# Altium footprint library Miscellaneous THD.PcbLib: 216 footprints (part 2 of 15)
Each footprint in its own frame and in the unit in brackets; x right, y up, seen from the top. Pads: shape width x height; smd on the part's side, far side on the other; paste and mask are expansions set on the pad; w line width, h text height; cw(c..) or ccw(c..) is an arc to the next point about the centre after c.
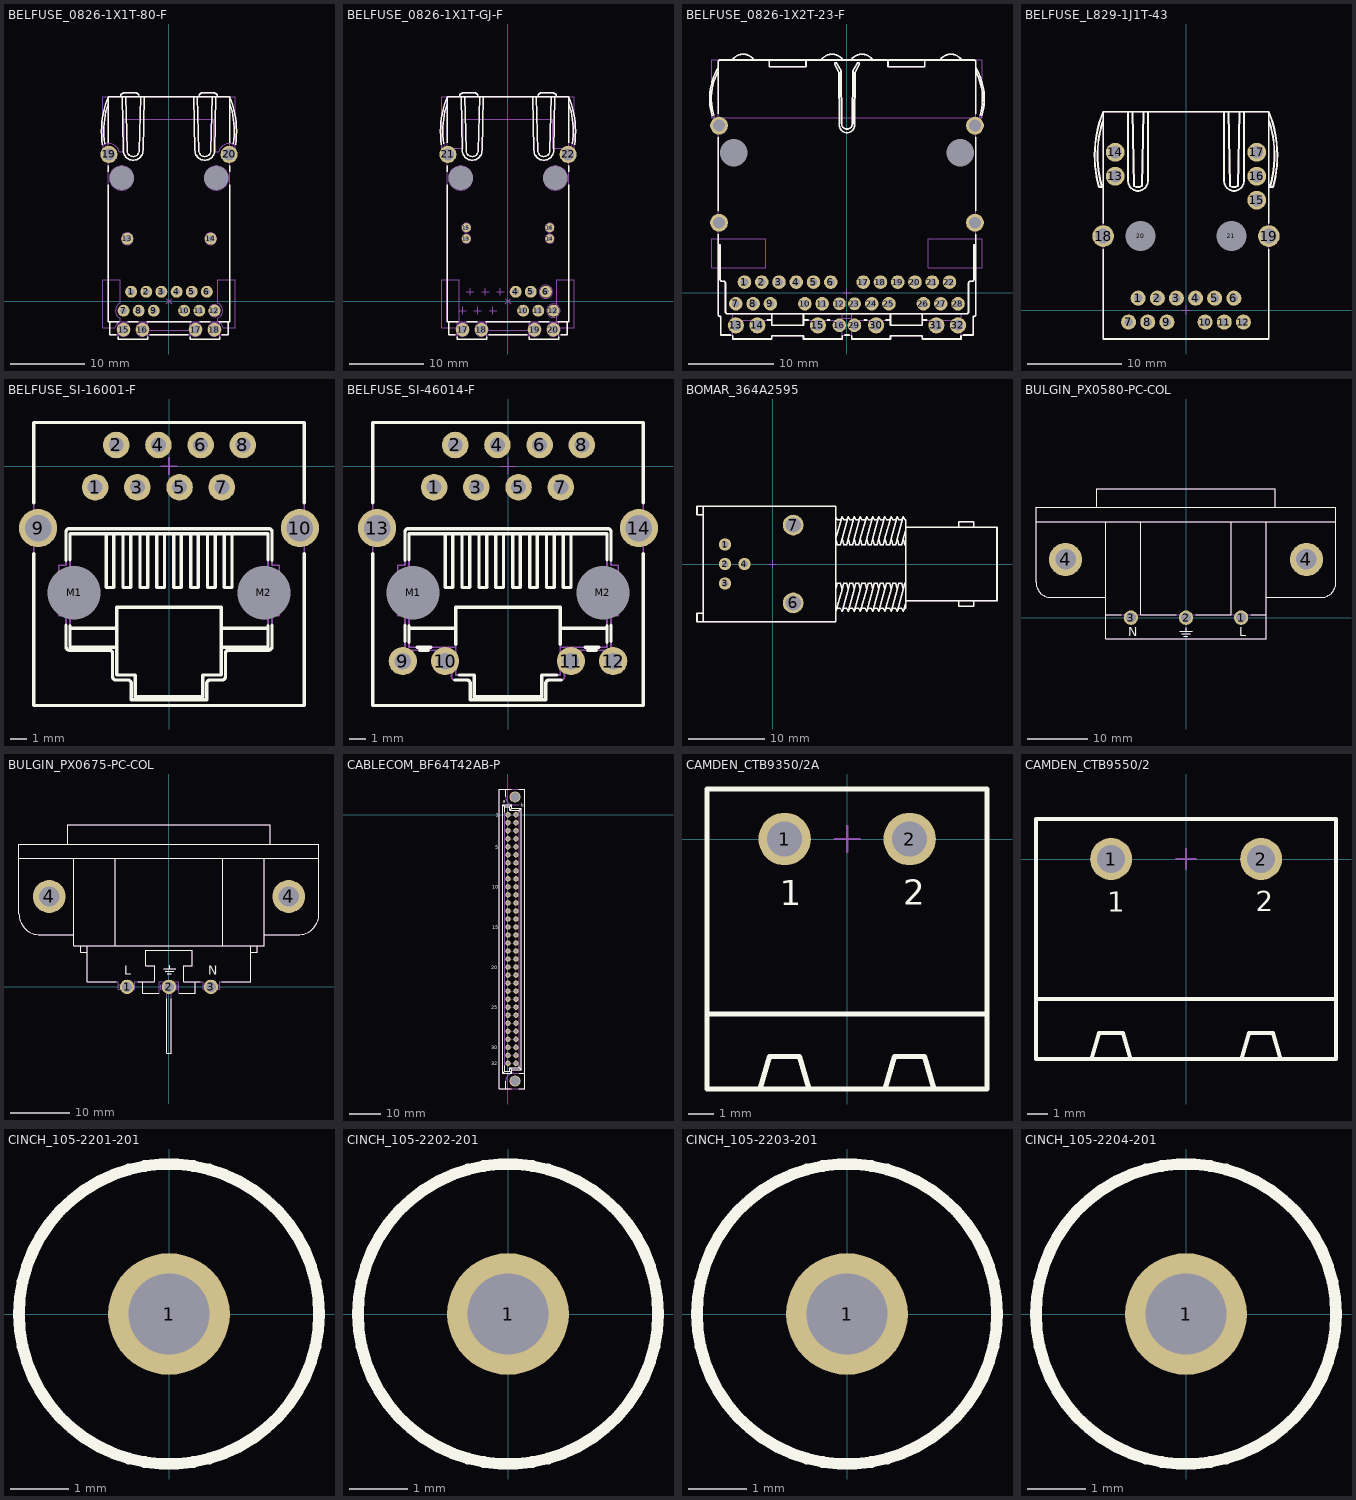
[diagram p1: the footprints below, top view; thin cyan lines are the x and y axes]

## BELFUSE_0826-1X1T-80-F [mm] "1 Port, Orange Green/Yellow LEDs, RJ45 1000BaseT, PoE, Gigabit MagJack® Connector Module"
height 13.61
pads (22):
  round 1.6 hole 0.9: 1(-5.075,1.27) 2(-3.045,1.27) 3(-1.015,1.27) 4(1.016,1.27) 5(3.048,1.27) 6(5.08,1.27) 7(-6.095,-1.27) 8(-4.065,-1.27) 9(-2.035,-1.27) 10(2.032,-1.27) 11(4.064,-1.27) 12(6.096,-1.27) 13(-5.59,8.38) 14(5.59,8.38)
  round 1.8 hole 1.1: 15(-6.096,-3.81) 16(-3.556,-3.81) 17(3.556,-3.81) 18(6.096,-3.81)
  round 2.3 hole 1.6: 19(-8.065,19.685) 20(8.065,19.685)
  round 1 hole 3.25 unplated mask+1.125: 21(-6.35,16.51) 22(6.35,16.51)
Top Overlay:
  lines w0.2: -8.924,20.975 cw(c3.316,22.785) -8.15,27.435 ; -8.642,21.124 cw(c3.316,22.785) -8.15,26.565 ; -8.15,15.638 -8.15,-2.765 -6.685,-2.765 ; -8.15,17.382 -8.15,18.137 ; -8.15,21.233 -8.15,27.435 ; -7.95,-2.765 -7.95,-4.465 -7.1,-4.465 ; -6.826,-4.762 -6.826,-5.065 -2.826,-5.065 -2.826,-4.763 ; -6.5,27.435 cw(c-6,27.435) -6,27.935 -4.5,27.935 cw(c-4.5,27.435) -4,27.435 ; -6.3,27.435 -6.12,20.222 ccw(c-4.8,20.222) -3.48,20.222 -3.3,27.435 ; -5.8,27.435 -5.619,20.222 ccw(c-4.8,20.222) -3.981,20.201 -3.8,27.435 ; -5.505,-2.765 -4.145,-2.765 ; -2.965,-2.765 2.965,-2.765 ; -2.549,-4.465 2.55,-4.465 ; 2.826,-4.763 2.826,-5.065 6.826,-5.065 6.826,-4.762 ; 3.3,27.435 3.48,20.222 ccw(c4.8,20.222) 6.12,20.222 6.3,27.435 ; 3.8,27.435 3.981,20.201 ccw(c4.8,20.222) 5.619,20.222 5.8,27.435 ; 4,27.435 cw(c4.5,27.435) 4.5,27.935 6,27.935 cw(c6,27.435) 6.5,27.435 ; 4.145,-2.765 5.505,-2.765 ; 6.685,-2.765 8.15,-2.765 8.15,15.638 ; 7.101,-4.465 7.95,-4.465 7.95,-2.765 ; 8.15,17.382 8.15,18.137 ; 8.15,21.233 8.15,27.435 ; 8.15,26.565 cw(c-3.316,22.785) 8.642,21.124 ; 8.924,20.975 ccw(c-3.316,22.785) 8.15,27.435 ; -8.15,27.435 8.15,27.435
Mechanical 8:
  circle w0.1: c5.075,1.27 r0.45
  circle w0.1: c-5.59,8.38 r0.45
  circle w0.1: c5.59,8.38 r0.45
  circle w0.1: c-5.59,8.38 r0.8
  circle w0.1: c5.59,8.38 r0.8
  circle w0.1: c6.095,-1.27 r0.45
  circle w0.1: c6.095,-3.81 r0.5
  circle w0.1: c-6.095,-3.81 r0.5
  circle w0.1: c6.095,-1.27 r0.8
  circle w0.1: c3.555,-3.81 r0.9
  circle w0.1: c-3.555,-3.81 r0.9
  circle w0.1: c-6.095,-3.81 r0.9
  circle w0.1: c6.095,-3.81 r0.9
  circle w0.1: c8.065,19.68 r0.785
  circle w0.1: c-8.065,19.68 r0.785
  circle w0.1: c-6.35,16.51 r1.625
  circle w0.1: c6.35,16.51 r1.625
  lines w0.1: -8.565,19.68 -8.065,19.68 ; -8.065,19.18 -8.065,19.68 ; -8.065,20.18 -8.065,19.68 ; -7.565,19.68 -8.065,19.68 ; -6.85,16.51 -6.35,16.51 ; -6.595,-3.81 -6.095,-3.81 ; -6.585,-1.27 -6.085,-1.27 ; -6.35,16.01 -6.35,16.51 ; -6.35,17.01 -6.35,16.51 ; -6.095,-4.31 -6.095,-3.81 ; -6.095,-3.31 -6.095,-3.81 ; -6.09,8.38 -5.59,8.38 ; -6.085,-1.77 -6.085,-1.27 ; -6.085,-0.77 -6.085,-1.27 ; -5.85,16.51 -6.35,16.51 ; -5.595,-3.81 -6.095,-3.81 ; -5.59,7.88 -5.59,8.38 ; -5.59,8.88 -5.59,8.38 ; -5.585,-1.27 -6.085,-1.27 ; -5.575,1.27 -5.075,1.27 ; -5.09,8.38 -5.59,8.38 ; -5.075,0.77 -5.075,1.27 ; -5.075,1.77 -5.075,1.27 ; -4.575,1.27 -5.075,1.27 ; -4.555,-1.27 -4.055,-1.27 ; -4.055,-3.81 -3.555,-3.81 ; -4.055,-1.77 -4.055,-1.27 ; -4.055,-0.77 -4.055,-1.27 ; -3.555,-4.31 -3.555,-3.81 ; -3.555,-3.31 -3.555,-3.81 ; -3.555,-1.27 -4.055,-1.27 ; -3.545,1.27 -3.045,1.27 ; -3.055,-3.81 -3.555,-3.81 ; -3.045,0.77 -3.045,1.27 ; -3.045,1.77 -3.045,1.27 ; -2.545,1.27 -3.045,1.27 ; -2.525,-1.27 -2.025,-1.27 ; -2.025,-1.77 -2.025,-1.27 ; -2.025,-0.77 -2.025,-1.27 ; -1.525,-1.27 -2.025,-1.27 ; -1.515,1.27 -1.015,1.27 ; -1.015,0.77 -1.015,1.27 ; -1.015,1.77 -1.015,1.27 ; -0.515,1.27 -1.015,1.27 ; -0.354,-0.354 0,0 ; -0.354,0.354 0,0 ; 0.354,-0.354 0,0 ; 0.354,0.354 0,0 ; 0.515,1.27 1.015,1.27 ; 1.015,0.77 1.015,1.27 ; 1.015,1.77 1.015,1.27 ; 1.515,1.27 1.015,1.27 ; 1.535,-1.27 2.035,-1.27 ; 2.035,-1.77 2.035,-1.27 ; 2.035,-0.77 2.035,-1.27 ; 2.535,-1.27 2.035,-1.27 ; 2.545,1.27 3.045,1.27 ; 3.045,0.77 3.045,1.27 ; 3.045,1.77 3.045,1.27 ; 3.055,-3.81 3.555,-3.81 ; 3.545,1.27 3.045,1.27 ; 3.555,-4.31 3.555,-3.81 ; 3.555,-3.31 3.555,-3.81 ; 3.565,-1.27 4.065,-1.27 ; 4.055,-3.81 3.555,-3.81 ; 4.065,-1.77 4.065,-1.27 ; 4.065,-0.77 4.065,-1.27 ; 4.565,-1.27 4.065,-1.27 ; 4.575,1.27 5.075,1.27 ; 5.075,0.77 5.075,1.27 ; 5.075,1.77 5.075,1.27 ; 5.09,8.38 5.59,8.38 ; 5.575,1.27 5.075,1.27 ; 5.59,7.88 5.59,8.38 ; 5.59,8.88 5.59,8.38 ; 5.595,-3.81 6.095,-3.81 ; 5.595,-1.27 6.095,-1.27 ; 5.85,16.51 6.35,16.51 ; 6.09,8.38 5.59,8.38 ; 6.095,-4.31 6.095,-3.81 ; 6.095,-3.31 6.095,-3.81 ; 6.095,-1.77 6.095,-1.27 ; 6.095,-0.77 6.095,-1.27 ; 6.35,16.01 6.35,16.51 ; 6.35,17.01 6.35,16.51 ; 6.595,-3.81 6.095,-3.81 ; 6.595,-1.27 6.095,-1.27 ; 6.85,16.51 6.35,16.51 ; 7.565,19.68 8.065,19.68 ; 8.065,19.18 8.065,19.68 ; 8.065,20.18 8.065,19.68 ; 8.565,19.68 8.065,19.68 ; -8.915,-3.56 -7.269,-3.56 cw(c-6.095,-3.81) -6.555,-2.702 -6.555,-2.265 cw(c-6.085,-1.27) -6.555,-0.275 -6.555,2.91 -8.915,2.91 -8.915,-3.56 ; -8.915,20.855 cw(c-8.065,19.68) -6.666,20.06 -5.995,20.06 -5.995,24.38 5.995,24.38 5.995,20.06 6.666,20.06 cw(c8.065,19.68) 8.915,20.855 8.915,27.43 -8.915,27.43 -8.915,20.855 ; 6.555,-2.702 cw(c6.095,-3.81) 7.269,-3.56 8.915,-3.56 8.915,2.91 6.555,2.91 6.555,-0.271 cw(c6.095,-1.27) 6.555,-2.269 6.555,-2.702
  text "Via KEEPOUT" at -5.2,25.45 h1
Mechanical 14:
  lines w0.1: -8.15,26.565 ccw(c3.316,22.785) -8.306,19.516 -8.595,19.435 cw(c3.316,22.785) -8.15,27.435 ; -7.95,-2.765 -7.95,-4.465 -6.826,-4.465 ; -6.826,-2.765 -6.826,-5.065 -2.826,-5.065 -2.826,-2.765 ; -6.5,27.435 cw(c-6,27.435) -6,27.935 -4.5,27.935 cw(c-4.5,27.435) -4,27.435 ; -6.3,27.435 -6.12,20.222 ccw(c-4.8,20.222) -3.48,20.222 -3.3,27.435 ; -5.8,27.435 -5.619,20.222 ccw(c-4.8,20.222) -3.981,20.201 -3.8,27.435 ; -2.826,-4.465 2.826,-4.465 ; -2.826,-3.865 2.826,-3.865 ; 2.826,-2.765 2.826,-5.065 6.826,-5.065 6.826,-2.765 ; 3.3,27.435 3.48,20.222 ccw(c4.8,20.222) 6.12,20.222 6.3,27.435 ; 3.8,27.435 3.981,20.201 ccw(c4.8,20.222) 5.619,20.222 5.8,27.435 ; 4,27.435 cw(c4.5,27.435) 4.5,27.935 6,27.935 cw(c6,27.435) 6.5,27.435 ; 6.826,-4.465 7.95,-4.465 7.95,-2.765 ; 8.15,26.565 cw(c-3.316,22.785) 8.306,19.516 8.595,19.435 ccw(c-3.316,22.785) 8.15,27.435 ; -8.15,27.435 -8.15,-2.765 8.15,-2.765 8.15,27.435 ; -8.15,27.435 8.15,27.435
3D body "BELFUSE_0826-1X1T-80-F.stp": height 14.51, standoff -3.47, extent -9.055,-5.065 9.055,27.935

## BELFUSE_0826-1X1T-GJ-F [mm] "1 Port, Orange Green/Yellow LEDs, RJ45 10/100BaseT, PoE, Ethernet MagJack® Connector Module"
height 13.61
pads (18):
  round 1.6 hole 0.9: 4(1.016,1.27) 5(3.048,1.27) 6(5.08,1.27) 10(2.032,-1.27) 11(4.064,-1.27) 12(6.096,-1.27)
  round 1.2 hole 0.6: 13(-5.59,8.38) 14(5.59,8.38) 15(-5.59,9.87) 16(5.59,9.87)
  round 1.8 hole 1.1: 17(-6.096,-3.81) 18(-3.556,-3.81) 19(3.556,-3.81) 20(6.096,-3.81)
  round 2.3 hole 1.6: 21(-8.065,19.685) 22(8.065,19.685)
  round 1 hole 3.25 unplated mask+1.125: 23(-6.35,16.51) 24(6.35,16.51)
Top Overlay:
  lines w0.2: -8.924,20.975 cw(c3.316,22.785) -8.15,27.435 ; -8.642,21.124 cw(c3.316,22.785) -8.15,26.565 ; -8.15,15.638 -8.15,-2.765 -6.685,-2.765 ; -8.15,17.382 -8.15,18.137 ; -8.15,21.233 -8.15,27.435 ; -7.95,-2.765 -7.95,-4.465 -7.1,-4.465 ; -6.826,-4.762 -6.826,-5.065 -2.826,-5.065 -2.826,-4.763 ; -6.5,27.435 cw(c-6,27.435) -6,27.935 -4.5,27.935 cw(c-4.5,27.435) -4,27.435 ; -6.3,27.435 -6.12,20.222 ccw(c-4.8,20.222) -3.48,20.222 -3.3,27.435 ; -5.8,27.435 -5.619,20.222 ccw(c-4.8,20.222) -3.981,20.201 -3.8,27.435 ; -5.505,-2.765 -4.145,-2.765 ; -2.965,-2.765 2.965,-2.765 ; -2.549,-4.465 2.55,-4.465 ; 2.826,-4.763 2.826,-5.065 6.826,-5.065 6.826,-4.762 ; 3.3,27.435 3.48,20.222 ccw(c4.8,20.222) 6.12,20.222 6.3,27.435 ; 3.8,27.435 3.981,20.201 ccw(c4.8,20.222) 5.619,20.222 5.8,27.435 ; 4,27.435 cw(c4.5,27.435) 4.5,27.935 6,27.935 cw(c6,27.435) 6.5,27.435 ; 4.145,-2.765 5.505,-2.765 ; 6.685,-2.765 8.15,-2.765 8.15,15.638 ; 7.101,-4.465 7.95,-4.465 7.95,-2.765 ; 8.15,17.382 8.15,18.137 ; 8.15,21.233 8.15,27.435 ; 8.15,26.565 cw(c-3.316,22.785) 8.642,21.124 ; 8.924,20.975 ccw(c-3.316,22.785) 8.15,27.435 ; -8.15,27.435 8.15,27.435
Mechanical 8:
  circle w0.1: c5.59,9.87 r0.35
  circle w0.1: c5.59,9.87 r0.6
  circle w0.1: c5.59,8.38 r0.35
  circle w0.1: c5.59,8.38 r0.6
  circle w0.1: c6.35,16.51 r1.625
  circle w0.1: c-6.35,16.51 r1.625
  circle w0.1: c-8.065,19.68 r0.785
  circle w0.1: c8.065,19.68 r0.785
  circle w0.1: c6.095,-3.81 r0.9
  circle w0.1: c-6.095,-3.81 r0.9
  circle w0.1: c-3.555,-3.81 r0.9
  circle w0.1: c3.555,-3.81 r0.9
  circle w0.1: c6.095,-1.27 r0.9
  circle w0.1: c5.075,1.27 r0.9
  circle w0.1: c-5.59,9.87 r0.6
  circle w0.1: c-5.59,8.38 r0.6
  circle w0.1: c-6.095,-3.81 r0.5
  circle w0.1: c6.095,-3.81 r0.5
  circle w0.1: c6.095,-1.27 r0.45
  circle w0.1: c-5.59,9.87 r0.35
  circle w0.1: c-5.59,8.38 r0.35
  lines w0.1: -8.565,19.68 -8.065,19.68 ; -8.065,19.18 -8.065,19.68 ; -8.065,20.18 -8.065,19.68 ; -7.565,19.68 -8.065,19.68 ; -6.85,16.51 -6.35,16.51 ; -6.595,-3.81 -6.095,-3.81 ; -6.595,-1.27 -6.095,-1.27 ; -6.35,16.01 -6.35,16.51 ; -6.35,17.01 -6.35,16.51 ; -6.095,-4.31 -6.095,-3.81 ; -6.095,-3.31 -6.095,-3.81 ; -6.095,-1.77 -6.095,-1.27 ; -6.095,-0.77 -6.095,-1.27 ; -6.09,8.38 -5.59,8.38 ; -6.09,9.87 -5.59,9.87 ; -5.85,16.51 -6.35,16.51 ; -5.595,-3.81 -6.095,-3.81 ; -5.595,-1.27 -6.095,-1.27 ; -5.59,7.88 -5.59,8.38 ; -5.59,8.88 -5.59,8.38 ; -5.59,9.37 -5.59,9.87 ; -5.59,10.37 -5.59,9.87 ; -5.575,1.27 -5.075,1.27 ; -5.09,8.38 -5.59,8.38 ; -5.09,9.87 -5.59,9.87 ; -5.075,0.77 -5.075,1.27 ; -5.075,1.77 -5.075,1.27 ; -4.575,1.27 -5.075,1.27 ; -4.565,-1.27 -4.065,-1.27 ; -4.065,-1.77 -4.065,-1.27 ; -4.065,-0.77 -4.065,-1.27 ; -4.055,-3.81 -3.555,-3.81 ; -3.565,-1.27 -4.065,-1.27 ; -3.555,-4.31 -3.555,-3.81 ; -3.555,-3.31 -3.555,-3.81 ; -3.545,1.27 -3.045,1.27 ; -3.055,-3.81 -3.555,-3.81 ; -3.045,0.77 -3.045,1.27 ; -3.045,1.77 -3.045,1.27 ; -2.545,1.27 -3.045,1.27 ; -2.535,-1.27 -2.035,-1.27 ; -2.035,-1.77 -2.035,-1.27 ; -2.035,-0.77 -2.035,-1.27 ; -1.535,-1.27 -2.035,-1.27 ; -1.515,1.27 -1.015,1.27 ; -1.015,0.77 -1.015,1.27 ; -1.015,1.77 -1.015,1.27 ; -0.515,1.27 -1.015,1.27 ; -0.354,-0.354 0,0 ; -0.354,0.354 0,0 ; 0.354,-0.354 0,0 ; 0.354,0.354 0,0 ; 0.515,1.27 1.015,1.27 ; 1.015,0.77 1.015,1.27 ; 1.015,1.77 1.015,1.27 ; 1.515,1.27 1.015,1.27 ; 1.535,-1.27 2.035,-1.27 ; 2.035,-1.77 2.035,-1.27 ; 2.035,-0.77 2.035,-1.27 ; 2.535,-1.27 2.035,-1.27 ; 2.545,1.27 3.045,1.27 ; 3.045,0.77 3.045,1.27 ; 3.045,1.77 3.045,1.27 ; 3.055,-3.81 3.555,-3.81 ; 3.545,1.27 3.045,1.27 ; 3.555,-4.31 3.555,-3.81 ; 3.555,-3.31 3.555,-3.81 ; 3.565,-1.27 4.065,-1.27 ; 4.055,-3.81 3.555,-3.81 ; 4.065,-1.77 4.065,-1.27 ; 4.065,-0.77 4.065,-1.27 ; 4.565,-1.27 4.065,-1.27 ; 4.575,1.27 5.075,1.27 ; 5.075,0.77 5.075,1.27 ; 5.075,1.77 5.075,1.27 ; 5.09,8.38 5.59,8.38 ; 5.09,9.87 5.59,9.87 ; 5.575,1.27 5.075,1.27 ; 5.59,7.88 5.59,8.38 ; 5.59,8.88 5.59,8.38 ; 5.59,9.37 5.59,9.87 ; 5.59,10.37 5.59,9.87 ; 5.595,-3.81 6.095,-3.81 ; 5.595,-1.27 6.095,-1.27 ; 5.85,16.51 6.35,16.51 ; 6.09,8.38 5.59,8.38 ; 6.09,9.87 5.59,9.87 ; 6.095,-4.31 6.095,-3.81 ; 6.095,-3.31 6.095,-3.81 ; 6.095,-1.77 6.095,-1.27 ; 6.095,-0.77 6.095,-1.27 ; 6.35,16.01 6.35,16.51 ; 6.35,17.01 6.35,16.51 ; 6.595,-3.81 6.095,-3.81 ; 6.595,-1.27 6.095,-1.27 ; 6.85,16.51 6.35,16.51 ; 7.565,19.68 8.065,19.68 ; 8.065,19.18 8.065,19.68 ; 8.065,20.18 8.065,19.68 ; 8.565,19.68 8.065,19.68 ; -8.915,-3.56 -8.915,2.91 -6.555,2.91 -6.555,-3.56 -8.915,-3.56 ; -8.915,20.52 -8.915,27.43 8.915,27.43 8.915,20.52 5.995,20.52 5.995,24.38 -5.995,24.38 -5.995,20.52 -8.915,20.52 ; 6.555,-3.56 6.555,2.91 8.915,2.91 8.915,-3.56 6.555,-3.56
Mechanical 14:
  lines w0.1: -8.15,26.565 ccw(c3.316,22.785) -8.306,19.516 -8.595,19.435 cw(c3.316,22.785) -8.15,27.435 ; -7.95,-2.765 -7.95,-4.465 -6.826,-4.465 ; -6.826,-2.765 -6.826,-5.065 -2.826,-5.065 -2.826,-2.765 ; -6.5,27.435 cw(c-6,27.435) -6,27.935 -4.5,27.935 cw(c-4.5,27.435) -4,27.435 ; -6.3,27.435 -6.12,20.222 ccw(c-4.8,20.222) -3.48,20.222 -3.3,27.435 ; -5.8,27.435 -5.619,20.222 ccw(c-4.8,20.222) -3.981,20.201 -3.8,27.435 ; -2.826,-4.465 2.826,-4.465 ; -2.826,-3.865 2.826,-3.865 ; 2.826,-2.765 2.826,-5.065 6.826,-5.065 6.826,-2.765 ; 3.3,27.435 3.48,20.222 ccw(c4.8,20.222) 6.12,20.222 6.3,27.435 ; 3.8,27.435 3.981,20.201 ccw(c4.8,20.222) 5.619,20.222 5.8,27.435 ; 4,27.435 cw(c4.5,27.435) 4.5,27.935 6,27.935 cw(c6,27.435) 6.5,27.435 ; 6.826,-4.465 7.95,-4.465 7.95,-2.765 ; 8.15,26.565 cw(c-3.316,22.785) 8.306,19.516 8.595,19.435 ccw(c-3.316,22.785) 8.15,27.435 ; -8.15,27.435 -8.15,-2.765 8.15,-2.765 8.15,27.435 ; -8.15,27.435 8.15,27.435
3D body "BELFUSE_0826-1X1T-GJ-F.stp": height 14.51, standoff -3.47, extent -9.055,-5.065 9.055,27.935

## BELFUSE_0826-1X2T-23-F [mm] "1 Port, Orange Green/Yellow LEDs, RJ45 1000BaseT, PoE, Gigabit MagJack® Connector Module"
height 13.61
pads (38):
  round 1.6 hole 0.9: 1(-12.06,1.27) 2(-10.03,1.27) 3(-8,1.27) 4(-5.97,1.27) 5(-3.94,1.27) 6(-1.91,1.27) 7(-13.08,-1.27) 8(-11.05,-1.27) 9(-9.02,-1.27) 10(-4.96,-1.27) 11(-2.93,-1.27) 17(1.91,1.27) 18(3.94,1.27) 19(5.97,1.27) 20(8,1.27) 21(10.03,1.27) 22(12.06,1.27) 24(2.91,-1.27) 25(4.94,-1.27) 26(9,-1.27) 27(11.03,-1.27) 28(13.06,-1.27)
  round 1.5 hole 0.9: 12(-0.9,-1.27) 23(0.88,-1.27)
  round 1.9 hole 1.2: 13(-13.08,-3.81) 14(-10.54,-3.81) 15(-3.43,-3.81) 30(3.43,-3.81) 31(10.52,-3.81) 32(13.06,-3.81)
  round 1.6 hole 1.1: 16(-0.9,-3.81) 29(0.88,-3.81)
  round 1 hole 3.25 unplated mask+1.125: H1(-13.33,16.51) H2(13.33,16.51)
  round 2.1 hole 1.4: SHIELD(-15.05,8.26) SHIELD(-15.05,19.68) SHIELD(15.05,8.26) SHIELD(15.05,19.68)
Top Overlay:
  lines w0.2: -15.84,20.836 cw(c-9.189,22.907) -15.139,26.53 ; -15.674,20.933 cw(c-9.274,22.888) -15.139,26.111 ; -15.139,1.168 -15.139,6.863 -15.139,-2.566 ccw(c-14.935,-2.566) -14.935,-2.769 -14.859,-2.769 -14.859,-4.953 -13.699,-4.953 ; -15.139,5.639 -14.935,5.639 -14.935,1.625 ccw(c-14.681,1.625) -14.681,1.371 -14.554,1.371 cw(c-14.554,1.117) -14.3,1.117 -14.3,-2.21 ccw(c-14.046,-2.21) -14.046,-2.464 14.046,-2.464 ccw(c14.046,-2.21) 14.3,-2.21 14.3,1.117 cw(c14.554,1.117) 14.554,1.371 14.681,1.371 ccw(c14.681,1.625) 14.935,1.625 14.935,5.639 15.138,5.639 ; -13.424,-5.064 -13.424,-5.423 -8.852,-5.423 -8.852,-5.042 -5.118,-5.042 -5.118,-5.423 -0.546,-5.423 -0.546,-5.061 ; -13.424,27.406 -13.424,27.495 cw(c-12.218,26.574) -11.011,27.495 -11.011,27.406 ; -9.399,-3.188 -8.852,-3.188 ; -9.144,27.406 -9.144,26.619 -4.826,26.619 -4.826,27.406 ; -8.852,-2.464 -8.852,-3.823 -5.118,-3.823 -5.118,-2.464 ; -5.118,-3.188 -4.572,-3.188 ; -2.959,27.406 -2.959,27.495 cw(c-1.753,26.574) -0.546,27.495 -0.546,27.406 ; -2.289,-3.188 -2.042,-3.188 ; -0.281,-4.953 0.261,-4.953 ; 0.546,-5.067 0.546,-5.423 5.118,-5.423 5.118,-5.042 8.852,-5.042 8.852,-5.423 13.424,-5.423 13.424,-5.058 ; 0.546,27.406 0.546,27.495 cw(c1.752,26.574) 2.959,27.495 2.959,27.406 ; 2.021,-3.188 2.288,-3.188 ; 4.571,-3.188 5.118,-3.188 ; 4.826,27.406 4.826,26.619 9.144,26.619 9.144,27.406 ; 5.118,-2.464 5.118,-3.823 8.852,-3.823 8.852,-2.464 ; 8.852,-3.188 9.398,-3.188 ; 11.011,27.406 11.011,27.495 cw(c12.217,26.574) 13.424,27.495 13.424,27.406 ; 13.679,-4.953 14.859,-4.953 14.859,-2.769 14.935,-2.769 ccw(c14.935,-2.566) 15.138,-2.566 15.138,6.863 15.138,1.168 ; 15.138,26.111 cw(c9.137,22.881) 15.669,20.935 ; 15.138,26.487 cw(c9.292,22.89) 15.841,20.835 ; -15.139,27.203 cw(c-14.935,27.203) -14.935,27.406 14.935,27.406 cw(c14.935,27.203) 15.138,27.203 ; -15.139,27.203 -15.139,21.077 -15.139,27.203 ; 15.138,27.203 15.138,21.077 15.138,27.203 ; -15.139,9.657 -15.139,18.283 -15.139,9.657 ; -1.434,26.891 cw(c-1.321,26.949) -1.208,27.008 -0.699,26.115 -0.641,19.913 ccw(c0,19.919) 0.641,19.913 0.698,26.115 1.208,27.008 cw(c1.321,26.949) 1.433,26.891 0.952,25.967 0.895,19.728 cw(c0,19.736) -0.895,19.728 -0.952,25.967 -1.434,26.891 ; 15.138,9.657 15.138,18.283 15.138,9.657
Mechanical 8:
  drawing of 168 lines, arcs and shapes, not listed
  text "Via KEEPOUT" at -4.55,23.425 h1
Mechanical 14:
  lines w0.1: -15.138,1.168 -15.138,27.203 ; -15.138,5.639 -14.935,5.639 -14.935,1.626 ccw(c-14.681,1.626) -14.681,1.372 -14.554,1.372 cw(c-14.554,1.118) -14.3,1.118 -14.3,-2.21 ccw(c-14.046,-2.21) -14.046,-2.464 14.046,-2.464 ccw(c14.046,-2.21) 14.3,-2.21 14.3,1.118 cw(c14.554,1.118) 14.554,1.372 14.681,1.372 ccw(c14.681,1.626) 14.935,1.626 14.935,5.639 15.138,5.639 ; -15.138,26.112 ccw(c-9.273,22.888) -15.443,20.295 -15.443,19.279 -15.646,19.279 -15.646,20.295 cw(c-9.189,22.907) -15.138,26.53 ; -13.424,-4.953 -14.859,-4.953 -14.859,-2.769 -14.935,-2.769 cw(c-14.935,-2.565) -15.138,-2.565 -15.138,27.203 ; -13.424,-3.188 -8.852,-3.188 ; -13.424,-2.464 -13.424,-5.423 -8.852,-5.423 -8.852,-5.042 -5.118,-5.042 -5.118,-5.423 -0.546,-5.423 -0.546,-2.464 ; -13.424,27.407 -13.424,27.495 cw(c-12.217,26.575) -11.011,27.496 -11.011,27.407 ; -9.144,27.407 -9.144,26.619 -4.826,26.619 -4.826,27.407 ; -8.852,-2.464 -8.852,-3.823 -5.118,-3.823 -5.118,-2.464 ; -5.118,-3.188 -0.546,-3.188 ; -2.959,27.407 -2.959,27.495 cw(c-1.753,26.575) -0.546,27.496 -0.546,27.407 ; -0.546,-4.953 0.546,-4.953 ; -0.546,-2.972 0.546,-2.972 ; 0.546,-3.188 5.118,-3.188 ; 0.546,-2.464 0.546,-5.423 5.118,-5.423 5.118,-5.042 8.852,-5.042 8.852,-5.423 13.424,-5.423 13.424,-2.464 ; 0.546,27.407 0.546,27.495 cw(c1.753,26.575) 2.959,27.496 2.959,27.407 ; 4.826,27.407 4.826,26.619 9.144,26.619 9.144,27.407 ; 5.118,-2.464 5.118,-3.823 8.852,-3.823 8.852,-2.464 ; 8.875,-3.188 13.424,-3.188 ; 11.011,27.407 11.011,27.495 cw(c12.217,26.575) 13.424,27.496 13.424,27.407 ; 13.424,-4.953 14.859,-4.953 14.859,-2.769 14.935,-2.769 ccw(c14.935,-2.565) 15.138,-2.565 15.138,27.203 ; 15.138,1.168 15.138,27.203 ; 15.138,26.112 cw(c9.137,22.881) 15.443,20.295 15.443,19.279 15.646,19.279 15.646,20.295 ccw(c9.292,22.891) 15.138,26.487 ; -15.138,27.203 cw(c-14.935,27.203) -14.935,27.407 14.935,27.407 cw(c14.935,27.203) 15.138,27.203 ; -1.433,26.891 cw(c-1.321,26.949) -1.208,27.008 -0.699,26.116 -0.641,19.914 ccw(c0,19.919) 0.641,19.914 0.699,26.116 1.208,27.008 cw(c1.321,26.949) 1.433,26.891 0.952,25.967 0.895,19.728 cw(c0,19.736) -0.895,19.728 -0.952,25.967 -1.433,26.891
3D body "BELFUSE_0826-1X2T-23-F.stp": height 14.65, standoff -3.63, extent -16.154,-5.423 16.154,28.092

## BELFUSE_L829-1J1T-43 [mm] "1 Port, Yellow/Green-Orange LEDs, Gigabit Ethernet, MagJack Connector Module"
height 11.3
pads (21):
  round 1.6 hole 0.9: 1(-5.08,1.27) 2(-3.048,1.27) 3(-1.016,1.27) 4(1.016,1.27) 5(3.048,1.27) 6(5.08,1.27) 7(-6.096,-1.27) 8(-4.064,-1.27) 9(-2.032,-1.27) 10(2.032,-1.27) 11(4.064,-1.27) 12(6.096,-1.27)
  round 2 hole 1.3: 13(-7.52,14.22) 14(-7.52,16.76) 15(7.52,11.68) 16(7.52,14.22) 17(7.52,16.76)
  round 2.3 hole 1.6: 18(-8.79,7.87) 19(8.79,7.87)
  round 1 hole 3.2 unplated mask+1.1: 20(-4.825,7.87) 21(4.825,7.87)
Top Overlay:
  lines w0.2: -8.79,6.47 -8.79,-3.06 8.79,-3.06 8.79,6.47 ; -8.79,9.27 -8.79,21.07 ; -8.79,20.2 ccw(c2.676,16.42) -8.923,13.07 -9.235,13.07 cw(c2.676,16.42) -8.79,21.07 ; -6.147,13.72 -6.147,21.07 ; -6.147,13.721 ccw(c-5.097,13.72) -4.047,13.719 -4.047,21.07 ; -5.7,21.07 -5.503,13.177 ; -5.466,13.157 ccw(c-5.097,13.89) -4.692,13.177 -4.494,21.07 ; 4.047,13.72 4.047,21.07 ; 4.047,13.721 ccw(c5.097,13.72) 6.147,13.719 6.147,21.07 ; 4.494,21.07 4.692,13.177 ; 4.728,13.157 ccw(c5.097,13.89) 5.503,13.177 5.7,21.07 ; 8.79,9.27 8.79,21.07 ; 8.79,20.2 cw(c-2.676,16.42) 8.923,13.07 9.235,13.07 ccw(c-2.676,16.42) 8.79,21.07 ; -8.79,21.07 8.79,21.07
Mechanical 8:
  lines w0.1: -9.29,7.87 -8.79,7.87 ; -8.79,7.37 -8.79,7.87 ; -8.79,8.37 -8.79,7.87 ; -8.29,7.87 -8.79,7.87 ; -8.02,14.22 -7.52,14.22 ; -8.02,16.76 -7.52,16.76 ; -7.52,13.72 -7.52,14.22 ; -7.52,14.72 -7.52,14.22 ; -7.52,16.26 -7.52,16.76 ; -7.52,17.26 -7.52,16.76 ; -7.02,14.22 -7.52,14.22 ; -7.02,16.76 -7.52,16.76 ; -6.596,-1.27 -6.096,-1.27 ; -6.096,-1.77 -6.096,-1.27 ; -6.096,-0.77 -6.096,-1.27 ; -5.596,-1.27 -6.096,-1.27 ; -5.58,1.27 -5.08,1.27 ; -5.325,7.87 -4.825,7.87 ; -5.08,0.77 -5.08,1.27 ; -5.08,1.77 -5.08,1.27 ; -4.825,7.37 -4.825,7.87 ; -4.825,8.37 -4.825,7.87 ; -4.58,1.27 -5.08,1.27 ; -4.564,-1.27 -4.064,-1.27 ; -4.325,7.87 -4.825,7.87 ; -4.064,-1.77 -4.064,-1.27 ; -4.064,-0.77 -4.064,-1.27 ; -3.564,-1.27 -4.064,-1.27 ; -3.548,1.27 -3.048,1.27 ; -3.048,0.77 -3.048,1.27 ; -3.048,1.77 -3.048,1.27 ; -2.548,1.27 -3.048,1.27 ; -2.532,-1.27 -2.032,-1.27 ; -2.032,-1.77 -2.032,-1.27 ; -2.032,-0.77 -2.032,-1.27 ; -1.532,-1.27 -2.032,-1.27 ; -1.516,1.27 -1.016,1.27 ; -1.016,0.77 -1.016,1.27 ; -1.016,1.77 -1.016,1.27 ; -0.516,1.27 -1.016,1.27 ; -0.5,0 0,0 ; 0,-0.5 0,0 ; 0,0.5 0,0 ; 0.5,0 0,0 ; 0.516,1.27 1.016,1.27 ; 1.016,0.77 1.016,1.27 ; 1.016,1.77 1.016,1.27 ; 1.516,1.27 1.016,1.27 ; 1.532,-1.27 2.032,-1.27 ; 2.032,-1.77 2.032,-1.27 ; 2.032,-0.77 2.032,-1.27 ; 2.532,-1.27 2.032,-1.27 ; 2.548,1.27 3.048,1.27 ; 3.048,0.77 3.048,1.27 ; 3.048,1.77 3.048,1.27 ; 3.548,1.27 3.048,1.27 ; 3.564,-1.27 4.064,-1.27 ; 4.064,-1.77 4.064,-1.27 ; 4.064,-0.77 4.064,-1.27 ; 4.325,7.87 4.825,7.87 ; 4.564,-1.27 4.064,-1.27 ; 4.58,1.27 5.08,1.27 ; 4.825,7.37 4.825,7.87 ; 4.825,8.37 4.825,7.87 ; 5.08,0.77 5.08,1.27 ; 5.08,1.77 5.08,1.27 ; 5.325,7.87 4.825,7.87 ; 5.58,1.27 5.08,1.27 ; 5.596,-1.27 6.096,-1.27 ; 6.096,-1.77 6.096,-1.27 ; 6.096,-0.77 6.096,-1.27 ; 6.596,-1.27 6.096,-1.27 ; 7.02,11.68 7.52,11.68 ; 7.02,14.22 7.52,14.22 ; 7.02,16.76 7.52,16.76 ; 7.52,11.18 7.52,11.68 ; 7.52,12.18 7.52,11.68 ; 7.52,13.72 7.52,14.22 ; 7.52,14.72 7.52,14.22 ; 7.52,16.26 7.52,16.76 ; 7.52,17.26 7.52,16.76 ; 8.02,11.68 7.52,11.68 ; 8.02,14.22 7.52,14.22 ; 8.02,16.76 7.52,16.76 ; 8.29,7.87 8.79,7.87 ; 8.79,7.37 8.79,7.87 ; 8.79,8.37 8.79,7.87 ; 9.29,7.87 8.79,7.87